# Altium footprint library Capacitors_Alu_Dip.PcbLib: 30 footprints (part 1 of 2)
Each footprint in its own frame and in the unit in brackets; x right, y up, seen from the top. Pads: shape width x height; smd on the part's side, far side on the other; paste and mask are expansions set on the pad; w line width, h text height; cw(c..) or ccw(c..) is an arc to the next point about the centre after c.
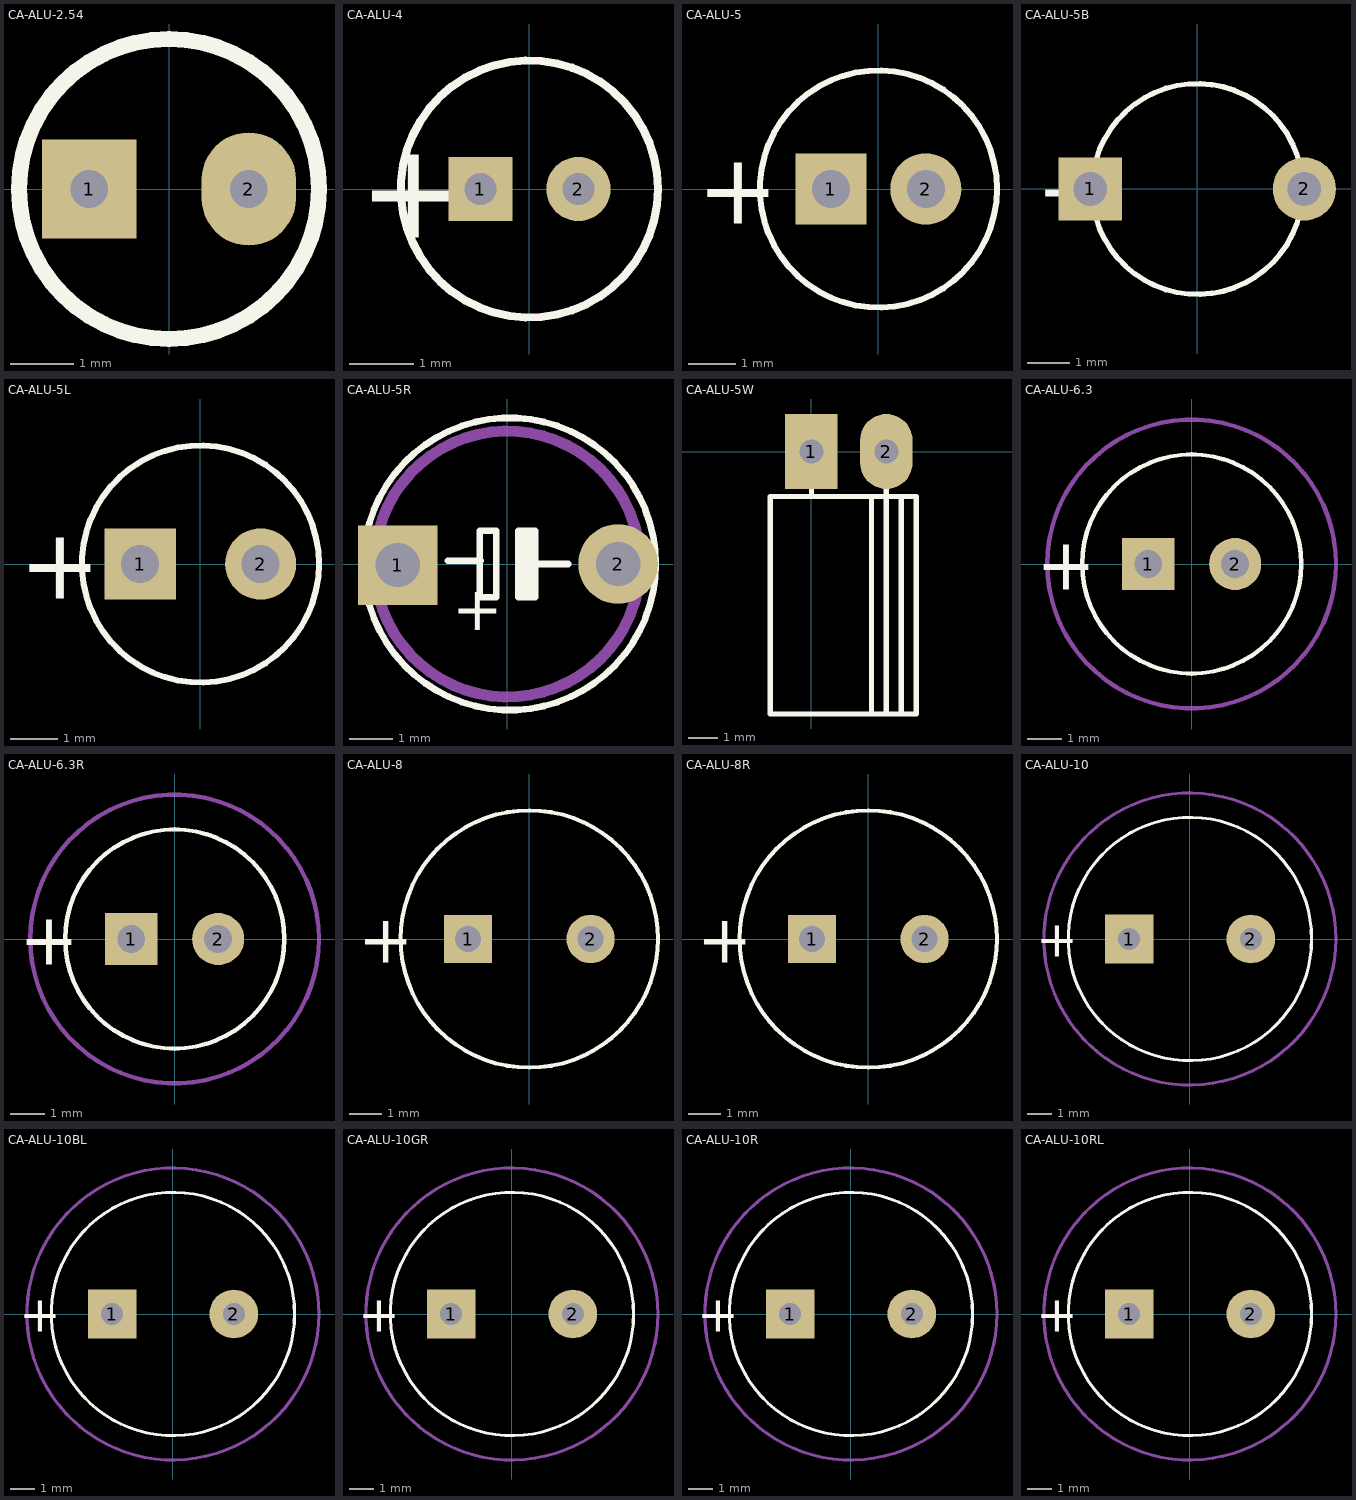
[diagram p0: the footprints below, top view; thin cyan lines are the x and y axes]

## CA-ALU-2.54 [mm]
pads (2):
  rect 1.5x1.58 hole 0.6: 1(-1.27,0)
  oval 1.5x1.8 hole 0.6: 2(1.27,0)
Top Overlay:
  circle w0.254: c0,0 r2.388
3D body "User Library-Capacitor Radial Electrolitic-150-400x700.step": height 7.01, standoff -2.7, extent -2,-2.025 1.993,1.975

## CA-ALU-4 [mm] "Polarized capacitors, Aluminum Electrolytic Capacitors, 2-Leads, Body 5x11x2x0.5"
height 11
pads (2):
  rect 1x1 hole 0.5: 1(-0.762,0)
  round 1 hole 0.5: 2(0.762,0)
Top Overlay:
  circle w0.127: c0,0 r2
  text "+" at -2.667,-0.762 h1.5
3D body "User Library-Cap 4x7.STEP": height 7.5, standoff -16.5, extent -2,-1.968 2,2.032

## CA-ALU-5 [mm] "Polarized capacitors, Aluminum Electrolytic Capacitors, 2-Leads, Body 5x11x2x0.5"
height 11
pads (2):
  rect 1.5x1.5 hole 0.8: 1(-1,0)
  round 1.5 hole 0.8: 2(1,0)
Top Overlay:
  circle w0.127: c0,0 r2.5
  text "+" at -3.825,-0.737 h1.5
3D body "User Library-cap 5x11.STEP": height 11, standoff -19, extent -2.413,-2.5 2.587,2.5

## CA-ALU-5B [mm] "Polarized capacitors, Aluminum Electrolytic Capacitors, 2-Leads, Body 5x11x2x0.5"
height 11
pads (2):
  rect 1.5x1.5 hole 0.8: 1(-2.54,0)
  round 1.5 hole 0.8: 2(2.54,0)
Top Overlay:
  circle w0.127: c0,0 r2.5
  text "+" at -3.825,-0.737 h1.5
3D body "5x12-1.step": height 15.2, standoff -1.4, extent -2.79,-2.54 2.79,2.54

## CA-ALU-5L [mm] "Polarized capacitors, Aluminum Electrolytic Capacitors, 2-Leads, Body 5x11x2x0.5"
height 11
pads (2):
  rect 1.5x1.5 hole 0.8: 1(-1.27,0)
  round 1.5 hole 0.8: 2(1.27,0)
Top Overlay:
  circle w0.127: c0,0 r2.5
  text "+" at -3.825,-0.737 h1.5
3D body "5x12.step": height 13.9, standoff -1.2, extent -2.54,-2.54 2.54,2.54

## CA-ALU-5R [mil]
pads (2):
  rect 72x72 hole 40: 1(-99,-1)
  round 72 hole 40: 2(100,0)
Top Overlay:
  circle w6: c2,0 r132
  rectangle: 9.99,-30 24.99,30
  lines w6: 25,0 55,0 25,0 ; 25,0 25,-30 10,-30 10,0 10,30 25,30 25,0 ; -54,3 -24,3 -54,3 ; -25,-30 -10,-30 -10,0 -10,30 -25,30 -25,0 -25,-30
  text "+" at -50,-60 h40
Mechanical 1:
  circle w10: c0,0 r120
3D body "5x13.step": height 551.18, standoff -80.55, extent -108.26,-98.42 108.28,98.43

## CA-ALU-5W [mil] "Tu hoa < 22uF/16>50V"
height 300
pads (2):
  rect 70x100 hole 32: 1(0,0)
  oval 70x100 hole 32: 2(100,0)
Top Overlay:
  lines w7: 0,-60 0,-45 ; 80,-350 80,-60 ; 100,-350 100,-60 100,-45 ; 120,-350 120,-60 ; 140,-350 140,-60 ; 140,-350 140,-60 ; 140,-350 -55,-350 -55,-60 140,-60
3D body "User Library-Cap electro 5x7x2mm RA.STEP": height 199.43, standoff -136.22, extent -54.42,-351.27 144.43,15.7

## CA-ALU-6.3 [mm] "Polarized capacitors, Aluminum Electrolytic Capacitors, 2-Leads, Body 6.3x15x2.5x0.5"
height 15
pads (2):
  rect 1.5x1.5 hole 0.8: 1(-1.25,0)
  round 1.5 hole 0.8: 2(1.25,0)
Top Overlay:
  circle w0.127: c0,0 r3.15
  text "+" at -4.475,-0.737 h1.5
Mechanical 15:
  circle w0.127: c0,0 r4.15
3D body "User Library-Cap 6_3x11.STEP": height 11, standoff -19, extent -3.125,-3.15 3.175,3.15

## CA-ALU-6.3R [mm] "Polarized capacitors, Aluminum Electrolytic Capacitors, 2-Leads, Body 6.3x15x2.5x0.5"
height 15
pads (2):
  rect 1.5x1.5 hole 0.8: 1(-1.25,0)
  round 1.5 hole 0.8: 2(1.25,0)
Top Overlay:
  circle w0.127: c0,0 r3.15
  text "+" at -4.475,-0.737 h1.5
Mechanical 15:
  circle w0.127: c0,0 r4.15
3D body "6.3x15x2.5x0.5.stp": height 15.26, standoff -19.96, extent -3.124,-3.133 3.14,3.15

## CA-ALU-8 [mm] "Polarized capacitors, Aluminum Electrolytic Capacitors, 2-Leads, Body 8x16x3.5x0.5"
height 16
pads (2):
  rect 1.5x1.5 hole 0.8: 1(-1.905,0)
  round 1.5 hole 0.8: 2(1.905,0)
Top Overlay:
  circle w0.127: c0,0 r4
  text "+" at -5.325,-0.737 h1.5
3D body "8x14.step": height 14.4, standoff -2.9, extent -4.1,-4.1 4.1,4.1

## CA-ALU-8R [mm] "Polarized capacitors, Aluminum Electrolytic Capacitors, 2-Leads, Body 8x16x3.5x0.5"
height 16
pads (2):
  rect 1.5x1.5 hole 0.8: 1(-1.75,0)
  round 1.5 hole 0.8: 2(1.75,0)
Top Overlay:
  circle w0.127: c0,0 r4
  text "+" at -5.325,-0.737 h1.5
3D body "8x16x3.5x0.5.stp": height 18.81, standoff -17.41, extent -4,-3.999 3.99,4

## CA-ALU-10 [mm] "Polarized capacitors, Aluminum Electrolytic Capacitors, 2-Leads, Body 10x20x5x0.6"
height 20
pads (2):
  rect 2x2 hole 0.9: 1(-2.5,0)
  round 2 hole 0.9: 2(2.5,0)
Top Overlay:
  circle w0.127: c0,0 r5
  text "+" at -6.325,-0.737 h1.5
Mechanical 15:
  circle w0.127: c0,0 r6
3D body "10x20.step": height 20.52, standoff -2.7, extent -5.08,-5.08 5.08,5.08

## CA-ALU-10BL [mm] "Polarized capacitors, Aluminum Electrolytic Capacitors, 2-Leads, Body 10x20x5x0.6"
height 20
pads (2):
  rect 2x2 hole 0.9: 1(-2.5,0)
  round 2 hole 0.9: 2(2.5,0)
Top Overlay:
  circle w0.127: c0,0 r5
  text "+" at -6.325,-0.737 h1.5
Mechanical 15:
  circle w0.127: c0,0 r6
3D body "10x16.step": height 16.2, standoff -3.1, extent -5.127,-5 4.875,5

## CA-ALU-10GR [mm] "Polarized capacitors, Aluminum Electrolytic Capacitors, 2-Leads, Body 10x20x5x0.6"
height 20
pads (2):
  rect 2x2 hole 0.9: 1(-2.5,0)
  round 2 hole 0.9: 2(2.5,0)
Top Overlay:
  circle w0.127: c0,0 r5
  text "+" at -6.325,-0.737 h1.5
Mechanical 15:
  circle w0.127: c0,0 r6
3D body "User Library-CAP 10X12_5.STEP": height 13.12, standoff -18.13, extent -4.88,-4.934 4.88,4.826

## CA-ALU-10R [mm] "Polarized capacitors, Aluminum Electrolytic Capacitors, 2-Leads, Body 10x20x5x0.6"
height 20
pads (2):
  rect 2x2 hole 0.9: 1(-2.5,0)
  round 2 hole 0.9: 2(2.5,0)
Top Overlay:
  circle w0.127: c0,0 r5
  text "+" at -6.325,-0.737 h1.5
Mechanical 15:
  circle w0.127: c0,0 r6
3D body "10x20x5x0.6.stp": height 18.91, standoff -21.31, extent -5.016,-4.978 4.974,5.02

## CA-ALU-10RL [mm] "Polarized capacitors, Aluminum Electrolytic Capacitors, 2-Leads, Body 10x20x5x0.6"
height 20
pads (2):
  rect 2x2 hole 0.9: 1(-2.5,0)
  round 2 hole 0.9: 2(2.5,0)
Top Overlay:
  circle w0.127: c0,0 r5
  text "+" at -6.325,-0.737 h1.5
Mechanical 15:
  circle w0.127: c0,0 r6
3D body "10x12.step": height 12, standoff -2.5, extent -5,-5 5,5